# Altium footprint library AD_Lib.PcbLib: 508 footprints (part 23 of 32)
Each footprint in its own frame and in the unit in brackets; x right, y up, seen from the top. Pads: shape width x height; smd on the part's side, far side on the other; paste and mask are expansions set on the pad; w line width, h text height; cw(c..) or ccw(c..) is an arc to the next point about the centre after c.
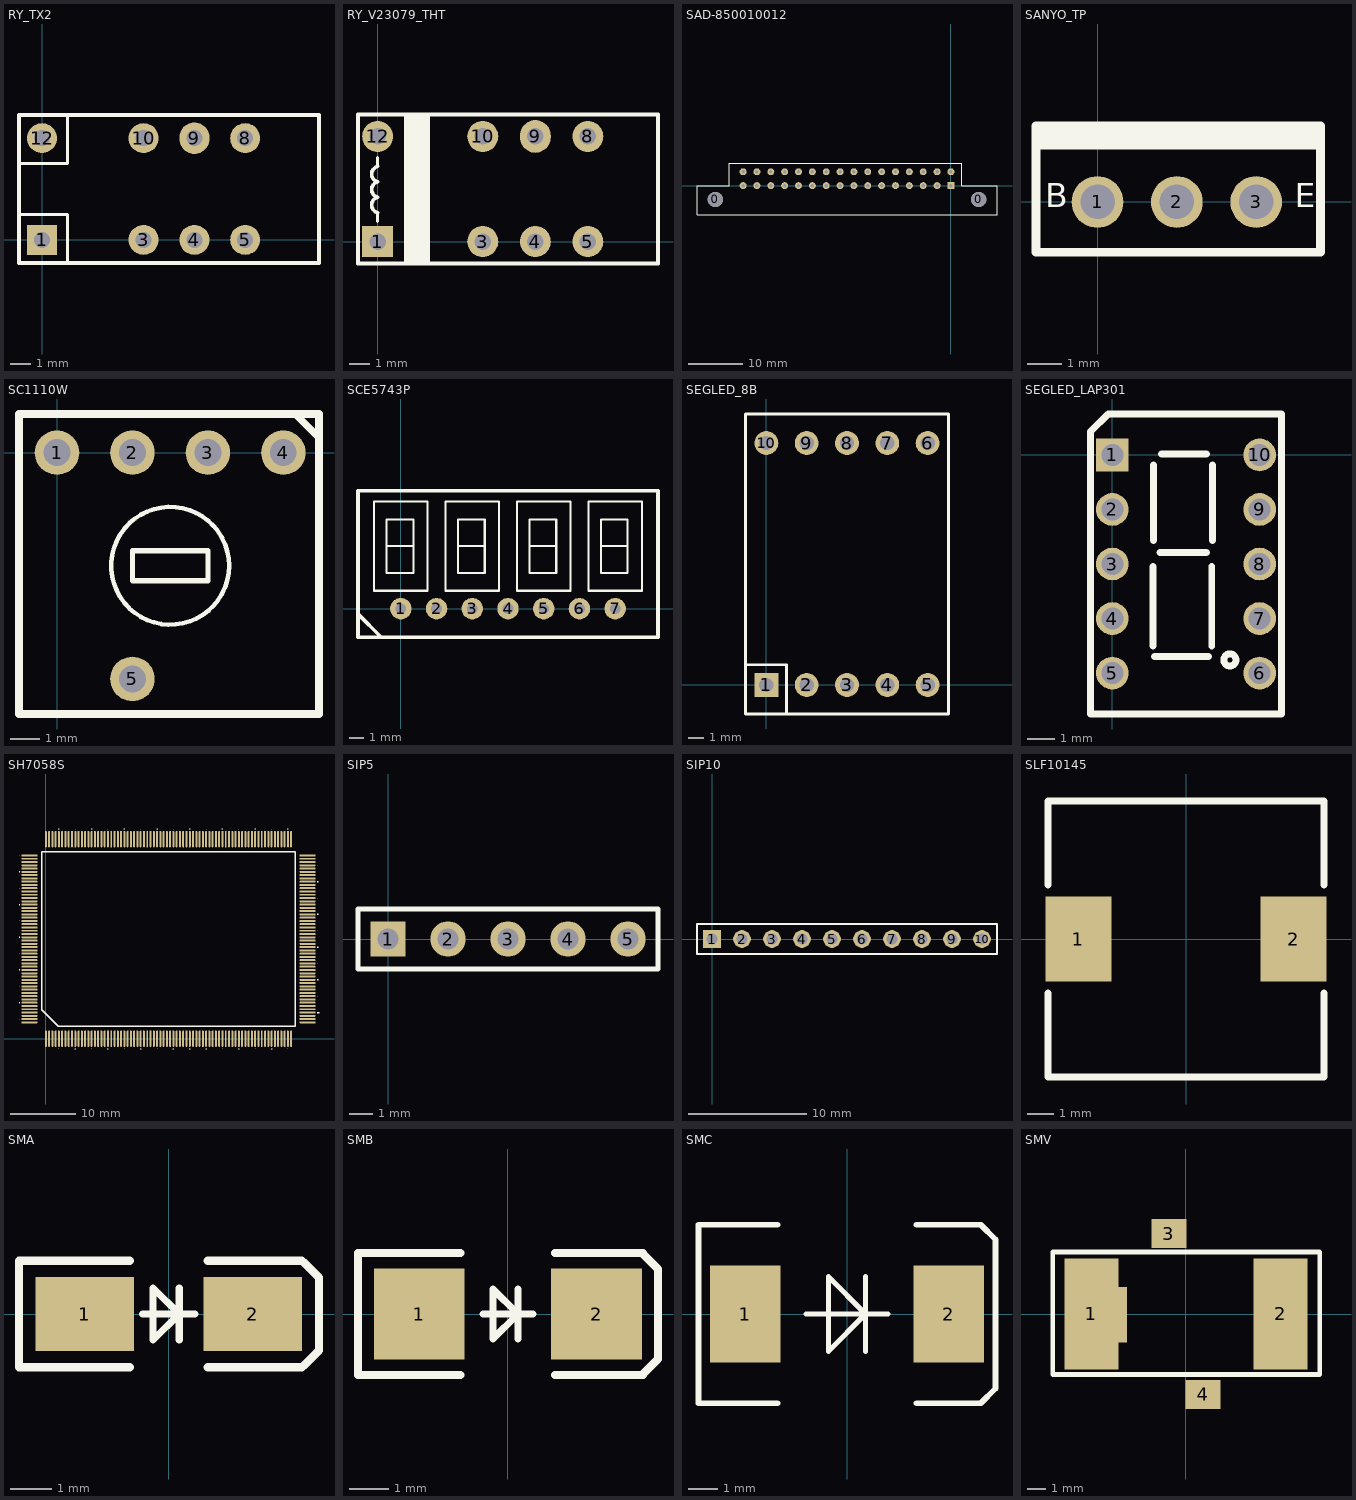
[diagram p22: the footprints below, top view; thin cyan lines are the x and y axes]

## RY_TX2 [mm] "Panasonic之TX2系列，如TX2-5V"
height 8.2
pads (8):
  rect 1.5x1.5 hole 0.8: 1(0,0)
  round 1.5 hole 0.8: 3(5.08,0) 4(7.62,0) 5(10.16,0) 8(10.16,5.08) 10(5.08,5.08) 12(0,5.08)
  oval 1.5x1.58 hole 0.8: 9(7.62,5.08)
Top Overlay:
  lines w0.152: -1.15,1.27 1.27,1.27 1.27,-1.16 ; -1.15,3.81 1.27,3.81 1.27,6.24
  lines w0.2: -1.15,-1.16 13.85,-1.16 13.85,6.24 -1.15,6.24 -1.15,-1.16
Bottom Overlay:
  lines w0.152: 0,0.963 0,1.395 ; 0,3.632 0,4.064 ; 5.08,1.27 5.08,1.905 7.112,1.905 ; 5.08,3.81 5.08,3.175 7.112,3.175 ; 7.048,2.095 7.62,1.524 7.62,1.27 ; 7.048,2.984 7.62,3.556 7.62,3.81 ; 8.255,1.905 10.16,1.905 10.16,1.27 ; 8.255,3.175 10.16,3.175 10.16,3.81
  lines w0.178: 0,1.395 cw(c0.093,1.768) 0,2.141 cw(c0.093,2.514) 0,2.886 cw(c0.093,3.259) 0,3.632

## RY_V23079_THT [mm] "继电器V23079直插系列，如V23079-A1005-B301"
height 9.8
pads (8):
  rect 1.5x1.5 hole 0.8: 1(0,0)
  round 1.5 hole 0.8: 3(5.08,0) 4(7.62,0) 5(10.16,0) 8(10.16,5.08) 10(5.08,5.08) 12(0,5.08)
  oval 1.5x1.58 hole 0.8: 9(7.62,5.08)
Top Overlay:
  rectangle: 1.27,-1.06 2.54,6.14
  lines w0.152: 0,0.963 0,1.395 ; 0,3.632 0,4.064
  lines w0.178: 0,1.395 cw(c0.093,1.768) 0,2.141 cw(c0.093,2.514) 0,2.886 cw(c0.093,3.259) 0,3.632
  lines w0.2: -0.95,-1.06 13.55,-1.06 13.55,6.14 -0.95,6.14 -0.95,-1.06

## SAD-850010012 [mm]
pads (34):
  round 2.8 hole 2.8: 0(-43.18,-2.54) 0(5.08,-2.54)
  rect 1.27x1.27 hole 0.635: 1(0,0)
  round 1.27 hole 0.635: 2(0,2.54) 3(-2.54,0) 4(-2.54,2.54) 5(-5.08,0) 6(-5.08,2.54) 7(-7.62,0) 8(-7.62,2.54) 9(-10.16,0) 10(-10.16,2.54) 11(-12.7,0) 12(-12.7,2.54) 13(-15.24,0) 14(-15.24,2.54) 15(-17.78,0) 16(-17.78,2.54) 17(-20.32,0) 18(-20.32,2.54) 19(-22.86,0) 20(-22.86,2.54) 21(-25.4,0) 22(-25.4,2.54) 23(-27.94,0) 24(-27.94,2.54) 25(-30.48,0) 26(-30.48,2.54) 27(-33.02,0) 28(-33.02,2.54) 29(-35.56,0) 30(-35.56,2.54) 31(-38.1,0) 32(-38.1,2.54)
Top Overlay:
  lines w0.203: -46.55,-5.3 8.45,-5.3 8.45,0 2.032,0 2.032,4.064 1.524,4.064 -40.64,4.064 -40.64,0 -46.55,0 -46.55,-5.3

## SANYO_TP [mm] "SANYO之NPN三极管，如2SC4615"
height 8
pads (3):
  round 1.5 hole 1: 1(0,0) 2(2.3,0) 3(4.6,0)
Top Overlay:
  rectangle: -1.778,1.524 6.464,2.159
  lines w0.254: -1.786,-1.456 -1.786,2.208 6.464,2.208 6.464,-1.456 -1.786,-1.456
  text "E" at 5.715,-0.381 h1.2
  text "B" at -1.524,-0.381 h1.2
Bottom Overlay:
  text "B" at 0.254,1.016 h1.2
  text "C" at 2.554,1.016 h1.2
  text "E" at 4.854,1.016 h1.2

## SC1110W [mm] "旋转编码器，有旋杆，非补码"
height 10.4
pads (5):
  round 1.5 hole 0.9: 1(0,0) 2(2.54,0) 3(5.08,0) 4(7.62,0) 5(2.54,-7.62)
Top Overlay:
  circle w0.152: c3.81,-3.81 r1.984
  lines w0.178: 2.54,-4.318 2.54,-3.302 5.08,-3.302 5.08,-4.318 2.54,-4.318
  lines w0.254: 7.82,1.3 8.02,1.3 8.82,0.5 8.82,0.3 ; -1.28,-8.8 8.82,-8.8 8.82,1.3 -1.28,1.3 -1.28,-8.8

## SCE5743P [mil] "点阵数码管"
height 59.06
pads (7):
  round 60 hole 30: 1(0,0) 2(100,0) 3(200,0) 4(300,0) 5(400,0) 6(500,0) 7(600,0)
Top Overlay:
  lines w6: -40,175 35,175 ; 160,175 235,175 ; 360,175 435,175 ; 560,175 635,175 ; -75,50 75,50 75,300 -75,300 -75,50 ; -40,100 35,100 35,250 -40,250 -40,100 ; 125,50 125,300 275,300 275,50 125,50 ; 160,100 160,250 235,250 235,100 160,100 ; 325,50 325,300 475,300 475,50 325,50 ; 360,100 360,250 435,250 435,100 360,100 ; 525,50 675,50 675,300 525,300 525,50 ; 560,100 635,100 635,250 560,250 560,100
  lines w10: -120,0 -120,-15 -55,-80 ; 715,330 -120,330 -120,-80 720,-80 720,330

## SEGLED_8B [mm] "LED, 7-Segment Display, 14.2 mm, RHD; 10 Leads; Row Space 15.24 mm; Pitch 2.54 mm"
height 8.25
pads (10):
  rect 1.5x1.5 hole 0.9: 1(0,0)
  round 1.5 hole 0.9: 2(2.54,0) 3(5.08,0) 4(7.62,0) 5(10.16,0) 6(10.16,15.24) 7(7.62,15.24) 8(5.08,15.24) 9(2.54,15.24) 10(0,15.24)
Top Overlay:
  lines w0.178: -1.27,1.27 1.27,1.27 1.27,-1.778
  lines w0.2: -1.32,-1.83 -1.32,17.07 11.48,17.07 11.48,-1.83 -1.32,-1.83
Mechanical 13:
  lines w0.1: -1.32,-1.83 11.48,-1.83 11.48,17.07 -1.32,17.07 -1.32,-1.83

## SEGLED_LAP301 [mm] "ROHM之LAP-301MB系列LED数码管，7段"
height 5
pads (10):
  rect 1.2x1.2 hole 0.8: 1(0,0)
  round 1.2 hole 0.8: 2(0,-2) 3(0,-4) 4(0,-6) 5(0,-8) 6(5.4,-8) 7(5.4,-6) 8(5.4,-4) 9(5.4,-2) 10(5.4,0)
Top Overlay:
  circle w0.254: c4.31,-7.517 r0.224
  lines w0.254: 1.486,-7.008 1.486,-4.088 ; 1.508,-3.135 1.508,-0.368 ; 1.55,-7.39 3.518,-7.39 ; 1.74,-3.58 3.454,-3.58 ; 1.808,0.032 3.454,0.032 ; 3.645,-7.008 3.645,-4.088 ; 3.667,-3.135 3.667,-0.368 ; -0.8,-9.5 6.2,-9.5 6.2,1.5 -0.151,1.5 -0.8,0.851 -0.8,-9.5

## SH7058S [mm]
height 1.75
pads (256):
  oval 0.3x2.5 smd: 1(0,0) 2(0.5,0) 3(1,0) 4(1.5,0) 5(2,0) 6(2.5,0) 7(3,0) 8(3.5,0) 9(4,0) 10(4.5,0) 11(5,0) 12(5.5,0) 13(6,0) 14(6.5,0) 15(7,0) 16(7.5,0) 17(8,0) 18(8.5,0) 19(9,0) 20(9.5,0) 21(10,0) 22(10.5,0) 23(11,0) 24(11.5,0) 25(12,0) 26(12.5,0) 27(13,0) 28(13.5,0) 29(14,0) 30(14.5,0) 31(15,0) 32(15.5,0) 33(16,0) 34(16.5,0) 35(17,0) 36(17.5,0) 37(18,0) 38(18.5,0) 39(19,0) 40(19.5,0) 41(20,0) 42(20.5,0) 43(21,0) 44(21.5,0) 45(22,0) 46(22.5,0) 47(23,0) 48(23.5,0) 49(24,0) 50(24.5,0) 51(25,0) 52(25.5,0) 53(26,0) 54(26.5,0) 55(27,0) 56(27.5,0) 57(28,0) 58(28.5,0) 59(29,0) 60(29.5,0) 61(30,0) 62(30.5,0) 63(31,0) 64(31.5,0) 65(32,0) 66(32.5,0) 67(33,0) 68(33.5,0) 69(34,0) 70(34.5,0) 71(35,0) 72(35.5,0) 73(36,0) 74(36.5,0) 75(37,0) 76(37.5,0) 129(37.5,30.5) 130(37,30.5) 131(36.5,30.5) 132(36,30.5) 133(35.5,30.5) 134(35,30.5) 135(34.5,30.5) 136(34,30.5) 137(33.5,30.5) 138(33,30.5) 139(32.5,30.5) 140(32,30.5) 141(31.5,30.5) 142(31,30.5) 143(30.5,30.5) 144(30,30.5) 145(29.5,30.5) 146(29,30.5) 147(28.5,30.5) 148(28,30.5) 149(27.5,30.5) 150(27,30.5) 151(26.5,30.5) 152(26,30.5) 153(25.5,30.5) 154(25,30.5) 155(24.5,30.5) 156(24,30.5) 157(23.5,30.5) 158(23,30.5) 159(22.5,30.5) 160(22,30.5) 161(21.5,30.5) 162(21,30.5) 163(20.5,30.5) 164(20,30.5) 165(19.5,30.5) 166(19,30.5) 167(18.5,30.5) 168(18,30.5) 169(17.5,30.5) 170(17,30.5) 171(16.5,30.5) 172(16,30.5) 173(15.5,30.5) 174(15,30.5) 175(14.5,30.5) 176(14,30.5) 177(13.5,30.5) 178(13,30.5) 179(12.5,30.5) 180(12,30.5) 181(11.5,30.5) 182(11,30.5) 183(10.5,30.5) 184(10,30.5) 185(9.5,30.5) 186(9,30.5) 187(8.5,30.5) 188(8,30.5) 189(7.5,30.5) 190(7,30.5) 191(6.5,30.5) 192(6,30.5) 193(5.5,30.5) 194(5,30.5) 195(4.5,30.5) 196(4,30.5) 197(3.5,30.5) 198(3,30.5) 199(2.5,30.5) 200(2,30.5) 201(1.5,30.5) 202(1,30.5) 203(0.5,30.5) 204(0,30.5)
  oval 2.5x0.3 smd: 77(40,2.5) 78(40,3) 79(40,3.5) 80(40,4) 81(40,4.5) 82(40,5) 83(40,5.5) 84(40,6) 85(40,6.5) 86(40,7) 87(40,7.5) 88(40,8) 89(40,8.5) 90(40,9) 91(40,9.5) 92(40,10) 93(40,10.5) 94(40,11) 95(40,11.5) 96(40,12) 97(40,12.5) 98(40,13) 99(40,13.5) 100(40,14) 101(40,14.5) 102(40,15) 103(40,15.5) 104(40,16) 105(40,16.5) 106(40,17) 107(40,17.5) 108(40,18) 109(40,18.5) 110(40,19) 111(40,19.5) 112(40,20) 113(40,20.5) 114(40,21) 115(40,21.5) 116(40,22) 117(40,22.5) 118(40,23) 119(40,23.5) 120(40,24) 121(40,24.5) 122(40,25) 123(40,25.5) 124(40,26) 125(40,26.5) 126(40,27) 127(40,27.5) 128(40,28) 205(-2.5,28) 206(-2.5,27.5) 207(-2.5,27) 208(-2.5,26.5) 209(-2.5,26) 210(-2.5,25.5) 211(-2.5,25) 212(-2.5,24.5) 213(-2.5,24) 214(-2.5,23.5) 215(-2.5,23) 216(-2.5,22.5) 217(-2.5,22) 218(-2.5,21.5) 219(-2.5,21) 220(-2.5,20.5) 221(-2.5,20) 222(-2.5,19.5) 223(-2.5,19) 224(-2.5,18.5) 225(-2.5,18) 226(-2.5,17.5) 227(-2.5,17) 228(-2.5,16.5) 229(-2.5,16) 230(-2.5,15.5) 231(-2.5,15) 232(-2.5,14.5) 233(-2.5,14) 234(-2.5,13.5) 235(-2.5,13) 236(-2.5,12.5) 237(-2.5,12) 238(-2.5,11.5) 239(-2.5,11) 240(-2.5,10.5) 241(-2.5,10) 242(-2.5,9.5) 243(-2.5,9) 244(-2.5,8.5) 245(-2.5,8) 246(-2.5,7.5) 247(-2.5,7) 248(-2.5,6.5) 249(-2.5,6) 250(-2.5,5.5) 251(-2.5,5) 252(-2.5,4.5) 253(-2.5,4) 254(-2.5,3.5) 255(-2.5,3) 256(-2.5,2.5)
Top Overlay:
  lines w0.203: -4.1,5.5 -4,5.5 ; -4.1,10.5 -4,10.5 ; -4.1,15.5 -4,15.5 ; -4.1,20.5 -4,20.5 ; -4.1,25.5 -4,25.5 ; 2,32 2,32.1 ; 4.5,-1.625 4.5,-1.5 ; 7,32 7,32.1 ; 9.5,-1.625 9.5,-1.5 ; 12,32 12,32.1 ; 14.5,-1.6 14.5,-1.5 ; 17,32 17,32.1 ; 19.5,-1.6 19.5,-1.5 ; 22,-1.625 22,-1.5 ; 22,32 22,32.1 ; 24.5,-1.6 24.5,-1.5 ; 27,32 27,32.1 ; 29.5,-1.6 29.5,-1.5 ; 32,32 32,32.1 ; 34.5,-1.6 34.5,-1.5 ; 37,32 37,32.1 ; 41.5,9 41.6,9 ; 41.5,14 41.6,14 ; 41.5,24 41.6,24 ; 41.6,4 41.5,4 41.75,4 ; 41.6,19 41.5,19 ; 22,-1.5 22,-1.5 ; 41.5,19 41.5,19 ; -4,3 -4,3 ; -4,8 -4,8 ; -4,13 -4,13 ; -4,18 -4,18 ; -4,23 -4,23 ; -4,28 -4,28 ; -0.635,4.445 -0.635,28.575 7.112,28.575 38.1,28.575 38.1,1.905 1.905,1.905 -0.635,4.445 ; 2,-1.5 2,-1.5 ; 4.5,32 4.5,32 ; 7,-1.5 7,-1.5 ; 9.5,32 9.5,32 ; 12,-1.5 12,-1.5 ; 14.5,32 14.5,32 ; 17,-1.5 17,-1.5 ; 19.5,32 19.5,32 ; 24.5,32 24.5,32 ; 27,-1.5 27,-1.5 ; 29.5,32 29.5,32 ; 32,-1.5 32,-1.5 ; 34.5,32 34.5,32 ; 37,-1.5 37,-1.5 ; 41.5,6.5 41.5,6.5 ; 41.5,11.5 41.5,11.5 ; 41.5,16.5 41.5,16.5 ; 41.5,21.5 41.5,21.5 ; 41.5,26.5 41.5,26.5

## SIP5 [mm] "Connector; Header; 5 Position"
height 2.03
pads (5):
  rect 1.5x1.5 hole 0.9: 1(0,0)
  round 1.5 hole 0.9: 2(2.54,0) 3(5.08,0) 4(7.62,0) 5(10.16,0)
Top Overlay:
  lines w0.2: -1.27,-1.27 -1.27,1.27 11.43,1.27 11.43,-1.27 -1.27,-1.27

## SIP10 [mm] "Connector; Header; 10 Position"
height 1.1
pads (10):
  rect 1.5x1.5 hole 0.9: 1(0,0)
  round 1.5 hole 0.9: 2(2.54,0) 3(5.08,0) 4(7.62,0) 5(10.16,0) 6(12.7,0) 7(15.24,0) 8(17.78,0) 9(20.32,0) 10(22.86,0)
Top Overlay:
  lines w0.2: -1.27,-1.27 -1.27,1.27 0.635,1.27 24.13,1.27 24.13,-1.27 -1.27,-1.27

## SLF10145 [mm] "TDK之SLF10145系列，SLF10145T-100M"
height 4.8
pads (2):
  rect 2.5x3.2 smd: 1(-4.05,0) 2(4.05,0)
Top Overlay:
  lines w0.254: -5.2,-2.032 -5.2,-5.2 5.2,-5.2 5.2,-2.032 ; -5.2,2.032 -5.2,5.2 5.2,5.2 5.2,2.032

## SMA [mm] "DO-214-AC/SMA"
height 2.44
pads (2):
  rect 2.4x1.8 smd: 1(-2.05,0) 2(2.05,0)
Top Overlay:
  lines w0.178: -0.635,0 0.635,0 ; 0.254,-0.635 0.254,0.635 ; -0.381,-0.635 0.254,0 -0.381,0.635 -0.381,-0.635
  lines w0.2: -0.95,-1.3 -3.65,-1.3 -3.65,1.3 -0.95,1.3 ; 0.95,-1.3 3.244,-1.3 ; 0.95,1.3 3.244,1.3 ; 3.284,-1.27 3.665,-0.889 3.665,0.889 3.284,1.27

## SMB [mm] "DO-214-AA/SMB"
height 2.54
pads (2):
  rect 2.3x2.3 smd: 1(-2.25,0) 2(2.25,0)
Top Overlay:
  lines w0.178: -0.635,0 0.635,0 ; 0.254,-0.635 0.254,0.635 ; -0.381,-0.635 -0.381,0.635 0.254,0 -0.381,-0.635
  lines w0.2: -1.2,-1.55 -3.8,-1.55 -3.8,1.55 -1.2,1.55 ; 1.2,-1.55 3.429,-1.55 ; 1.2,1.55 3.429,1.55 ; 3.429,-1.524 3.81,-1.143 3.81,1.143 3.429,1.524

## SMC [mm] "DO-214-AB/SMC"
height 2.57
pads (2):
  rect 2.4x3.3 smd: 1(-3.475,0) 2(3.475,0)
Top Overlay:
  lines w0.178: -1.397,0 1.397,0 ; 0.635,-1.27 0.635,1.27 ; -0.635,-1.27 -0.635,1.27 0.635,0 -0.635,-1.27
  lines w0.2: -2.375,-3.048 -5.075,-3.048 -5.075,3.048 -2.375,3.048 ; 2.375,-3.048 4.572,-3.048 5.075,-2.545 5.075,2.545 4.572,3.048 2.375,3.048

## SMV [mm]
pads (5):
  rect 2.85x5.85 smd: 1(-5,0) 2(5,0)
  rect 2.8x0 smd: 1(-4.52,-0.046)
  rect 1.85x1.55 smd: 3(-0.9,4.25) 4(0.9,-4.25)
Top Overlay:
  lines w0.254: -7.035,-3.196 7.062,-3.196 7.062,3.281 -7.035,3.281 -7.035,-3.196